# Altium footprint library Footprint.PcbLib: 137 footprints (part 4 of 9)
Each footprint in its own frame and in the unit in brackets; x right, y up, seen from the top. Pads: shape width x height; smd on the part's side, far side on the other; paste and mask are expansions set on the pad; w line width, h text height; cw(c..) or ccw(c..) is an arc to the next point about the centre after c.
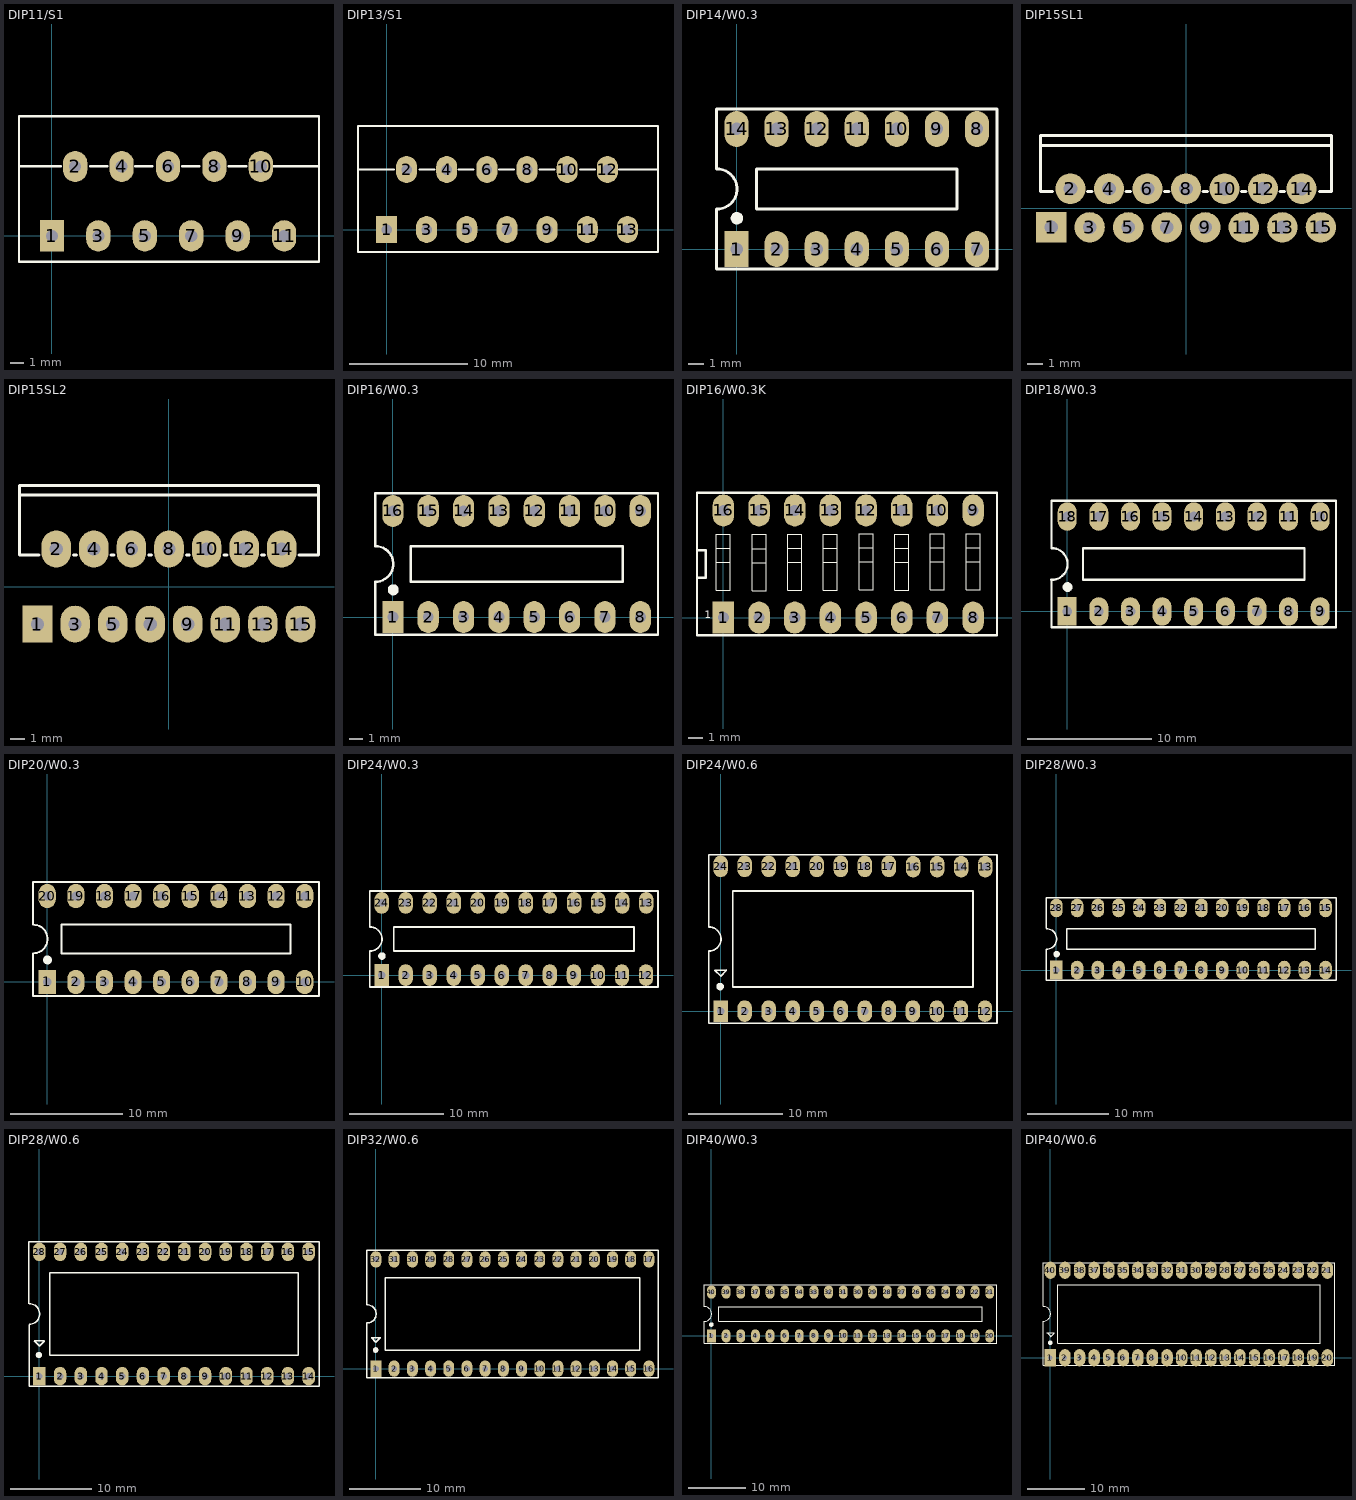
[diagram p3: the footprints below, top view; thin cyan lines are the x and y axes]

## DIP11/S1 [mil] "11 Pins, w=200mil., pitch=100mil"
pads (11):
  rect 70x90 hole 35: 1(0,0)
  oval 70x90 hole 35: 2(66.93,200) 3(133.86,0) 4(200.79,200) 5(267.72,0) 6(334.65,200) 7(401.57,0) 8(468.5,200) 9(535.43,0) 10(602.36,200) 11(669.29,0)
Top Overlay:
  lines w7: -95,200 25,200 ; 110,200 160,200 ; 240,200 290,200 ; 375,200 425,200 ; 510,200 560,200 ; 630,200 770,200 ; -95,-75 770,-75 770,345 -95,345 -95,-75

## DIP13/S1 [mil] "13 Pins, w=200mil, Pitch=100mil"
pads (13):
  rect 70x90 hole 35: 1(0,0)
  oval 70x90 hole 35: 2(66.93,200) 3(133.86,0) 4(200.79,200) 5(267.72,0) 6(334.65,200) 7(401.57,0) 8(468.5,200) 9(535.43,0) 10(602.36,200) 11(669.29,0) 12(736.22,200) 13(803.15,0)
Top Overlay:
  lines w7: -95,200 25,200 ; 110,200 160,200 ; 240,200 290,200 ; 375,200 425,200 ; 510,200 560,200 ; 645,200 695,200 ; 775,200 905,200 ; -95,-75 905,-75 905,345 -95,345 -95,-75

## DIP14/W0.3 [mil] "14PINs, W=300mil, Pitch=100mil"
height 100
pads (14):
  rect 60x90 hole 31: 1(0,0)
  oval 60x90 hole 31: 2(100,0) 3(200,0) 4(300,0) 5(400,0) 6(500,0) 7(600,0) 8(600,300) 9(500,300) 10(400,300) 11(300,300) 12(200,300) 13(100,300) 14(0,300)
Top Overlay:
  circle w15: c1,77 r8
  lines w7: -50.38,100.05 ccw(c-48.69,150.02) -50,200 ; -50,100 -50,-50 650,-50 650,350 -50,350 -50,201 ; 50,100 50,200 550,200 550,100 50,100
3D body "SW3DPS-DIP-14-DEFAULT.STEP": height 145.48, standoff -129.32, extent -69.99,-12.47 680.01,302.49

## DIP15SL1 [mm] "TO, Thru-Hole, Vertical, Heatsink Mounted; 15 Bent Staggered Leads; Pitch=1.27 mm"
height 17.3
pads (15):
  rect 2x2 hole 0.9: 1(-8.89,-1.27)
  round 2 hole 0.9: 2(-7.62,1.27) 3(-6.35,-1.27) 4(-5.08,1.27) 5(-3.81,-1.27) 6(-2.54,1.27) 7(-1.27,-1.27) 8(0,1.27) 9(1.27,-1.27) 10(2.54,1.27) 11(3.81,-1.27) 12(5.08,1.27) 13(6.35,-1.27) 14(7.62,1.27) 15(8.89,-1.27)
Top Overlay:
  lines w0.2: -9.6,4.13 9.6,4.13 ; -8.8,1.08 -9.6,1.08 -9.6,4.78 9.6,4.78 9.6,1.08 8.8,1.08 ; -6.5,1.08 -6.2,1.08 ; -3.96,1.08 -3.66,1.08 ; -1.42,1.08 -1.12,1.08 ; 1.12,1.08 1.42,1.08 ; 3.66,1.08 3.96,1.08 ; 6.2,1.08 6.5,1.08
3D body "User Library-MULTIWAT T15.step": height 22.74, standoff -2.18, extent -9.8,-1.778 9.8,7.29

## DIP15SL2 [mm] "TO, Thru-Hole, Vertical, Heatsink Mounted; 15 Bent Staggered Leads; Pitch 1.27 mm"
height 21
pads (15):
  rect 2x2.5 hole 0.9: 1(-8.89,-2.54)
  oval 2x2.5 hole 0.9: 2(-7.62,2.54) 3(-6.35,-2.54) 4(-5.08,2.54) 5(-3.81,-2.54) 6(-2.54,2.54) 7(-1.27,-2.54) 8(0,2.54) 9(1.27,-2.54) 10(2.54,2.54) 11(3.81,-2.54) 12(5.08,2.54) 13(6.35,-2.54) 14(7.62,2.54) 15(8.89,-2.54)
Top Overlay:
  lines w0.2: -10.1,6.19 10.1,6.19 ; -8.8,2.14 -10.1,2.14 -10.1,6.84 10.1,6.84 10.1,2.14 8.8,2.14 ; -6.45,2.14 -6.25,2.14 ; -3.91,2.14 -3.71,2.14 ; -1.37,2.14 -1.17,2.14 ; 1.17,2.14 1.37,2.14 ; 3.71,2.14 3.91,2.14 ; 6.25,2.14 6.45,2.14
3D body "User Library-MULTIWAT T15.step": height 22.74, standoff -2.18, extent -9.698,-2.79 9.902,6.279

## DIP16/W0.3 [mil] "16 PIN, W=300mil, Pitch=100mil"
height 100
pads (16):
  rect 60x90 hole 31: 1(0,0)
  oval 60x90 hole 31: 2(100,0) 3(200,0) 4(300,0) 5(400,0) 6(500,0) 7(600,0) 8(700,0) 9(700,300) 10(600,300) 11(500,300) 12(400,300) 13(300,300) 14(200,300) 15(100,300) 16(0,300)
Top Overlay:
  circle w15: c1,77 r8
  lines w7: -50.38,100.05 ccw(c-48.69,150.02) -50,200 ; -50,100 -50,-50 750,-50 750,350 -49,350 -50,349 ; -50,201 -50,350 ; 50,100 50,200 650,200 650,100 50,100
3D body "SW3dPS-DIP 16 _ socket 214.STEP": height 299.42, standoff -131.12, extent -51.7,-57.39 751.7,356

## DIP16/W0.3K [mil] "16 PIN, W 300mil, Pin to pin 100mil For Switch"
height 100
pads (16):
  rect 60x90 hole 31.5: 1(0,0)
  oval 60x90 hole 31.5: 2(100,0) 3(200,0) 4(300,0) 5(400,0) 6(500,0) 7(600,0) 8(700,0) 9(700,300) 10(600,300) 11(500,300) 12(400,300) 13(300,300) 14(200,300) 15(100,300) 16(0,300)
Top Overlay:
  lines w1.5: -19.68,155 19.68,155 ; -19.68,194.37 19.68,194.37 ; 80.31,154 119.69,154 ; 80.31,193.37 119.69,193.37 ; 180.31,155 219.69,155 ; 180.31,194.37 219.69,194.37 ; 280.31,155 319.69,155 ; 280.31,194.37 319.69,194.37 ; 380.31,156 419.69,156 ; 380.31,195.37 419.69,195.37 ; 480.31,155 519.68,155 ; 480.31,194.37 519.68,194.37 ; 580.32,156 619.68,156 ; 580.32,195.37 619.68,195.37 ; 680.32,156 719.68,156 ; 680.32,195.37 719.68,195.37 ; -19.68,76.26 19.68,76.26 19.68,233.74 -19.68,233.74 -19.68,76.26 ; 80.31,75.26 119.69,75.26 119.69,232.74 80.31,232.74 80.31,75.26 ; 180.31,76.26 219.69,76.26 219.69,233.74 180.31,233.74 180.31,76.26 ; 280.31,76.26 319.69,76.26 319.69,233.74 280.31,233.74 280.31,76.26 ; 380.31,77.26 419.69,77.26 419.69,234.74 380.31,234.74 380.31,77.26 ; 480.31,76.26 519.68,76.26 519.68,233.74 480.31,233.74 480.31,76.26 ; 580.32,77.26 619.68,77.26 619.68,234.74 580.32,234.74 580.32,77.26 ; 680.32,77.26 719.68,77.26 719.68,234.74 680.32,234.74 680.32,77.26
  lines w7: -74,69.5 -74,234 ; -74,111 -49,111 -49,189 -73,189 -74,190 ; -74,125 -74,-49 -73,-50 767,-50 767,350 -74,350 -74,175
  text "1" at -52,-2 h20
3D body "SW3dPS-DIP SWITCH 8 POS CTS 206.STEP": height 324.8, standoff -137.8, extent -92.91,-40 792.91,345.04

## DIP18/W0.3 [mil] "18 PIN, W 300mil, Pitch 100mil"
height 100
pads (18):
  rect 60x90 hole 31: 1(0,0)
  oval 60x90 hole 31: 2(100,0) 3(200,0) 4(300,0) 5(400,0) 6(500,0) 7(600,0) 8(700,0) 9(800,0) 10(800,300) 11(700,300) 12(600,300) 13(500,300) 14(400,300) 15(300,300) 16(200,300) 17(100,300) 18(0,300)
Top Overlay:
  circle w15: c1,77 r8
  lines w7: -50.38,100.05 ccw(c-48.69,150.02) -50,200 ; -50,100 -50,-50 850,-50 850,350 -50,350 -50,201 ; 50,100 50,200 750,200 750,100 50,100
3D body "SW3dPS-DIP18.STEP": height 118.71, standoff -131.12, extent -51.18,-57.39 849.18,356

## DIP20/W0.3 [mil] "20 PIN, W 300mil, Pin to pin 100mil"
height 100
pads (20):
  rect 60x85 hole 31: 1(0,0)
  oval 60x85 hole 31: 2(100,0) 3(200,0) 4(300,0) 5(400,0) 6(500,0) 7(600,0) 8(700,0) 9(800,0) 10(900,0) 11(900,300) 12(800,300) 13(700,300) 14(600,300) 15(500,300) 16(400,300) 17(300,300) 18(200,300) 19(100,300) 20(0,300)
Top Overlay:
  circle w15: c1,77 r8
  lines w7: -50.38,100.05 ccw(c-48.69,150.02) -50,200 ; -50,100 -50,-50 950,-50 950,350 -50,350 -50,201 ; 50,100 50,200 850,200 850,100 50,100
3D body "User Library-20-pin-dip.STEP": height 155, standoff -130, extent -91,-18 945,322

## DIP24/W0.3 [mil] "DIP24/W.300, Pin to pin 100mil"
height 100
pads (24):
  rect 60x90 hole 31: 1(0,0)
  oval 60x90 hole 31: 2(100,0) 3(200,0) 4(300,0) 5(400,0) 6(500,0) 7(600,0) 8(700,0) 9(800,0) 10(900,0) 11(1000,0) 12(1100,0) 13(1101,300) 14(1001,300) 15(901,300) 16(801,300) 17(700,300) 18(600,300) 19(500,300) 20(400,300) 21(300,300) 22(200,300) 23(100,300) 24(0,300)
Top Overlay:
  circle w15: c1,79 r8
  lines w7: -50.38,100.05 ccw(c-48.69,150.02) -50,200 ; -50,100 -50,-50 1150,-50 1150,350 -50,350 -50,201 ; 50,100 50,200 1050,200 1050,100 50,100
3D body "SW3dPS-DIP24-300.STEP": height 200, standoff -98.03, extent -89.04,-2.92 1181.04,306.92

## DIP24/W0.6 [mil] "DIP24/W.600, Pin to pin 100mil"
height 100
pads (24):
  rect 60x90 hole 31: 1(0,0)
  oval 60x90 hole 31: 2(100,0) 3(200,0) 4(300,0) 5(400,0) 6(500,0) 7(600,0) 8(700,0) 9(800,0) 10(900,0) 11(1000,0) 12(1100,0) 13(1101,601) 14(1001,601) 15(901,601) 16(801,601) 17(700,602) 18(600,602) 19(500,602) 20(400,602) 21(300,602) 22(200,602) 23(100,602) 24(0,602)
Top Overlay:
  circle w15: c-2,102 r8
  lines w7: -50,350 -50,650 1150,650 1150,-50 -50,-50 -50,250 ccw(c-48.31,299.97) -49.62,349.95 ; -25,170 -24,170 0,146 0,145 24,169 24,171 23,170 -25,170 ; 50,100 1050,100 1050,500 50,500 50,100
3D body "SW3DPS-DIP 24 IC WITH 0_280IN WINDOW-DEFAULT.STEP": height 227.95, standoff -129.92, extent -82.52,0.16 1202.52,600

## DIP28/W0.3 [mil] "28 PIN, W 300mil, Pin to pin 100mil"
height 100
pads (28):
  rect 60x90 hole 31: 1(0,0)
  oval 60x90 hole 31: 2(100,0) 3(200,0) 4(300,0) 5(400,0) 6(500,0) 7(600,0) 8(700,0) 9(800,0) 10(900,0) 11(1000,0) 12(1100,0) 13(1200,0) 14(1300,0) 15(1300,300) 16(1200,300) 17(1100,300) 18(1000,300) 19(900,300) 20(800,300) 21(700,300) 22(600,300) 23(500,300) 24(400,300) 25(300,300) 26(200,300) 27(100,300) 28(0,300)
Top Overlay:
  circle w15: c1,77 r8
  lines w7: -50.38,100.05 ccw(c-48.69,150.02) -50,200 ; -50,100 -50,-50 1350,-50 1350,350 -50,350 -50,201 ; 50,100 50,200 1250,200 1250,100 50,100
3D body "SW3dPS-DIP28-300.STEP": height 200, standoff -98.03, extent -50,-10 1367.32,299.84

## DIP28/W0.6 [mil] "DIP28/W.600, Pin to pin 100mil"
height 100
pads (28):
  rect 60x90 hole 31: 1(0,0)
  oval 60x90 hole 31: 2(100,0) 3(200,0) 4(300,0) 5(400,0) 6(500,0) 7(600,0) 8(700,0) 9(800,0) 10(900,0) 11(1000,0) 12(1100,0) 13(1200,0) 14(1300,0) 15(1300,600) 16(1200,600) 17(1100,600) 18(1000,600) 19(900,600) 20(800,600) 21(700,600) 22(600,600) 23(500,600) 24(400,600) 25(300,600) 26(200,600) 27(100,600) 28(0,600)
Top Overlay:
  circle w15: c-2,102 r8
  lines w7: -51,350 -51,650 1350,650 1350,-50 -50,-50 -50,249 ; -50,250 ccw(c-48.31,299.97) -49.62,349.95 ; -25,170 23,170 24,171 24,169 0,145 0,146 -24,170 -25,170 ; 50,100 50,500 1250,500 1250,100 50,100
3D body "SW3dPS-DIP28-600.STEP": height 224.41, standoff -101.57, extent -84.25,0.16 1384.25,610

## DIP32/W0.6 [mil] "DIP32/W.600, Pin to pin 100mil"
height 100
pads (32):
  rect 60x90 hole 31: 1(0,0)
  oval 60x90 hole 31: 2(100,0) 3(200,0) 4(300,0) 5(400,0) 6(500,0) 7(600,0) 8(700,0) 9(800,0) 10(900,0) 11(1000,0) 12(1100,0) 13(1200,0) 14(1300,0) 15(1400,0) 16(1500,0) 17(1500,600) 18(1400,600) 19(1300,600) 20(1200,600) 21(1100,600) 22(1000,600) 23(900,600) 24(800,600) 25(700,600) 26(600,600) 27(500,600) 28(400,600) 29(300,600) 30(200,600) 31(100,600) 32(0,600)
Top Overlay:
  circle w15: c-2,102 r8
  lines w7: -50.38,251.05 ccw(c-48.69,301.02) -50,351 ; -50,251 -50,-50 1550,-50 1550,650 -50,650 -50,352 ; -25,170 23,170 24,171 24,169 0,145 0,146 -24,170 -25,170 ; 50,100 1450,100 1450,500 50,500 50,100
3D body "SW3DPS-DIP 32 IC WITH 0_380IN WINDOW-DEFAULT.STEP": height 227.95, standoff -129.92, extent -77.56,0 1577.56,601.81

## DIP40/W0.3 [mil] "40 PIN, W 300mil, Pin to pin 100mil"
height 100
pads (40):
  rect 60x90 hole 31: 1(0,0)
  oval 60x90 hole 31: 2(100,0) 3(200,0) 4(300,0) 5(400,0) 6(500,0) 7(600,0) 8(700,0) 9(800,0) 10(900,0) 11(1000,0) 12(1100,0) 13(1200,0) 14(1300,0) 15(1400,0) 16(1500,0) 17(1600,0) 18(1700,0) 19(1800,0) 20(1900,0) 21(1900,300) 22(1800,300) 23(1700,300) 24(1600,300) 25(1500,300) 26(1400,300) 27(1300,300) 28(1200,300) 29(1100,300) 30(1000,300) 31(900,300) 32(800,300) 33(700,300) 34(600,300) 35(500,300) 36(400,300) 37(300,300) 38(200,300) 39(100,300) 40(0,300)
Top Overlay:
  circle w15: c-1,78 r8
  lines w7: -50.38,100.05 ccw(c-48.69,150.02) -50,200 ; -50,100 -50,-50 1950,-50 1950,350 -50,350 -50,201 ; 50,100 1850,100 1850,200 50,200 50,100

## DIP40/W0.6 [mm] "40 PIN, W 600mil, Pin to pin 100mil"
height 2.54
pads (40):
  rect 2x3 hole 0.787: 1(0,0)
  oval 2x3 hole 0.787: 2(2.54,0) 3(5.08,0) 4(7.62,0) 5(10.16,0) 6(12.7,0) 7(15.24,0) 8(17.78,0) 9(20.32,0) 10(22.86,0) 11(25.4,0) 12(27.94,0) 13(30.48,0) 14(33.02,0) 15(35.56,0) 16(38.1,0) 17(40.64,0) 18(43.18,0) 19(45.72,0) 20(48.26,0) 21(48.26,15.24) 22(45.72,15.24) 23(43.18,15.24) 24(40.64,15.24) 25(38.1,15.24) 26(35.56,15.24) 27(33.02,15.24) 28(30.48,15.24) 29(27.94,15.24) 30(25.4,15.24) 31(22.86,15.24) 32(20.32,15.24) 33(17.78,15.24) 34(15.24,15.24) 35(12.7,15.24) 36(10.16,15.24) 37(7.62,15.24) 38(5.08,15.24) 39(2.54,15.24) 40(0,15.24)
Top Overlay:
  circle w0.381: c-0.025,2.591 r0.203
  lines w0.178: -1.28,6.377 ccw(c-1.237,7.646) -1.27,8.915 ; -1.27,6.375 -1.27,-1.27 49.53,-1.27 49.53,16.51 -1.27,16.51 -1.27,8.941 ; -0.61,4.318 -0.584,4.318 0.025,3.708 0.025,3.683 0.635,4.293 0.635,4.343 0.61,4.318 -0.61,4.318 ; 1.27,2.54 46.99,2.54 46.99,12.7 1.27,12.7 1.27,2.54
3D body "SW3dPS-DIP40-600.STEP": height 5.7, standoff -2.58, extent -2.095,-0.254 50.355,15.236